# Altium footprint library Inductors THD.PcbLib: 43 footprints (part 3 of 4) (continued)
## IND_TECHPOWER_C20800136 [mm] "3-wire Common Mode Power Inductor" (continued)
  text "10" at 23.19,-4.894 h1
  text "9" at 19.264,-13.426 h1
  text "6" at -16.327,-17.004 h1
  text "5" at -21.247,-9.957 h1
  text "2" at -6.598,22.734 h1
  text "1" at 1.902,23.579 h1
  text "7" at -1.344,-6.369 h1
  text "8" at 1.473,-6.34 h1
  text "11" at 6.149,2.165 h1
  text "12" at 4.574,4.661 h1
  text "3" at -4.858,4.334 h1
  text "4" at -6.245,1.847 h1
Mechanical 8:
  circle w0.1: c0,0 r2
  circle w0.1: c0,0 r10
  circle w0.1: c0,0 r22.5
  circle w0.1: c9.659,2.588 r1
  circle w0.1: c7.66,6.428 r1
  circle w0.1: c0,22.5 r1
  circle w0.1: c-3.907,22.158 r1
  circle w0.1: c-7.071,7.071 r1
  circle w0.1: c-9.397,3.42 r1
  circle w0.1: c-2.588,-9.659 r1
  circle w0.1: c1.736,-9.848 r1
  circle w0.1: c-17.236,-14.463 r1
  circle w0.1: c-19.486,-11.25 r1
  circle w0.1: c19.486,-11.25 r1
  circle w0.1: c21.143,-7.695 r1
  lines w0.1: -19.919,-11.5 -19.486,-11.25 ; -19.736,-10.817 -19.486,-11.25 ; -19.236,-11.683 -19.486,-11.25 ; -19.053,-11 -19.486,-11.25 ; -17.619,-14.784 -17.236,-14.463 ; -17.557,-14.08 -17.236,-14.463 ; -16.915,-14.846 -17.236,-14.463 ; -16.853,-14.141 -17.236,-14.463 ; -9.897,3.42 -9.397,3.42 ; -9.397,2.92 -9.397,3.42 ; -9.397,3.92 -9.397,3.42 ; -8.897,3.42 -9.397,3.42 ; -7.571,7.071 -7.071,7.071 ; -7.071,6.571 -7.071,7.071 ; -7.071,7.571 -7.071,7.071 ; -6.571,7.071 -7.071,7.071 ; -4.399,22.071 -3.907,22.158 ; -3.994,22.651 -3.907,22.158 ; -3.82,21.666 -3.907,22.158 ; -3.415,22.245 -3.907,22.158 ; -3.021,-9.909 -2.588,-9.659 ; -2.838,-9.226 -2.588,-9.659 ; -2.338,-10.092 -2.588,-9.659 ; -2.155,-9.409 -2.588,-9.659 ; -0.5,0 0,0 ; -0.5,22.5 0,22.5 ; 0,-0.5 0,0 ; 0,0.5 0,0 ; 0,22 0,22.5 ; 0,23 0,22.5 ; 0.5,0 0,0 ; 0.5,22.5 0,22.5 ; 1.303,-10.098 1.736,-9.848 ; 1.486,-9.415 1.736,-9.848 ; 1.986,-10.281 1.736,-9.848 ; 2.169,-9.598 1.736,-9.848 ; 7.227,6.678 7.66,6.428 ; 7.41,5.995 7.66,6.428 ; 7.91,6.861 7.66,6.428 ; 8.093,6.178 7.66,6.428 ; 9.226,2.838 9.659,2.588 ; 9.409,2.155 9.659,2.588 ; 9.909,3.021 9.659,2.588 ; 10.092,2.338 9.659,2.588 ; 19.053,-11 19.486,-11.25 ; 19.236,-11.683 19.486,-11.25 ; 19.736,-10.817 19.486,-11.25 ; 19.919,-11.5 19.486,-11.25 ; 20.673,-7.524 21.143,-7.695 ; 20.972,-8.165 21.143,-7.695 ; 21.314,-7.226 21.143,-7.695 ; 21.613,-7.866 21.143,-7.695 ; -19.486,-11.25 0,0 ; -17.236,-14.463 0,0 ; -9.397,3.42 0,0 ; -7.071,7.071 0,0 ; -3.907,22.158 0,0 ; -2.588,-9.659 0,0 ; 0,0 0,22.5 ; 0,0 19.486,-11.25 ; 0,0 21.143,-7.695 ; 0,0 1.736,-9.848 ; 0,0 9.659,2.588 ; 0,0 7.66,6.428
  text "1" at -0.25,22 h1
  text "2" at -4.182,21.602 h1
  text "5" at -18.867,-11.321 h1
  text "6" at -16.631,-14.406 h1
  text "9" at 19.236,-10.682 h1
  text "10" at 20.879,-6.96 h1
  text "3" at -6.98,6.455 h1
  text "4" at -9.064,2.873 h1
  text "7" at -2.121,-9.267 h1
  text "8" at 1.994,-9.295 h1
  text "11" at 9.047,2.942 h1
  text "12" at 6.872,6.589 h1
Mechanical 14:
  circle w0.1: c0,0 r25.25
  circle w0.1: c0,0 r2
  circle w0.5: c-2.288,26.15 r0.2
  circle w0.5: c-21.503,-15.056 r0.2
  circle w0.5: c23.791,-11.094 r0.2
  lines w0.1: -19.523,6.254 ccw(c0,0) -18.14,-9.549 ; -18.975,7.758 cw(c0,0) -18.14,9.549 ; -17.34,-10.935 ccw(c0,0) -16.206,-12.554 ; -17.34,10.935 cw(c0,0) -16.206,12.554 ; -15.178,-13.78 ccw(c0,0) -13.78,-15.178 ; -15.178,13.78 cw(c0,0) -13.78,15.178 ; -12.554,-16.206 ccw(c0,0) -10.935,-17.34 ; -12.554,16.206 cw(c0,0) -10.935,17.34 ; -11.525,3.343 ccw(c0,0) -10.769,-5.294 ; -10.978,4.847 cw(c0,0) -10.769,5.294 ; -9.969,-6.679 ccw(c0,0) -9.686,-7.083 ; -9.969,6.679 cw(c0,0) -9.686,7.083 ; -9.549,-18.14 ccw(c0,0) -7.758,-18.975 ; -9.549,18.14 cw(c0,0) -7.758,18.975 ; -8.658,-8.309 ccw(c0,0) -8.309,-8.658 ; -8.658,8.309 cw(c0,0) -8.309,8.658 ; -7.083,-9.686 ccw(c0,0) -6.679,-9.969 ; -7.083,9.686 cw(c0,0) -6.679,9.969 ; -6.254,-19.523 ccw(c0,0) -4.345,-20.034 ; -6.254,19.523 cw(c0,0) -4.345,20.034 ; -5.294,-10.769 ccw(c0,0) -4.847,-10.978 ; -5.294,10.769 cw(c0,0) -4.847,10.978 ; -3.343,-11.525 ccw(c0,0) -2.867,-11.652 ; -3.343,11.525 cw(c0,0) -2.867,11.652 ; -2.769,-20.312 ccw(c0,0) -0.8,-20.484 ; -2.769,20.312 cw(c0,0) -0.8,20.484 ; -1.291,-11.93 ccw(c0,0) -0.8,-11.973 ; -1.291,11.93 cw(c0,0) -0.8,11.973 ; 0.8,-20.484 ccw(c0,0) 2.769,-20.312 ; 0.8,-11.973 ccw(c0,0) 1.291,-11.93 ; 0.8,11.973 cw(c0,0) 8.658,8.309 ; 0.8,20.484 cw(c0,0) 15.178,13.78 ; 2.867,-11.652 ccw(c0,0) 9.969,-6.679 ; 4.345,-20.034 ccw(c0,0) 17.34,-10.935 ; 9.686,7.083 cw(c0,0) 9.969,6.679 ; 10.769,-5.294 ccw(c0,0) 10.978,-4.847 ; 10.769,5.294 cw(c0,0) 10.978,4.847 ; 11.525,-3.343 ccw(c0,0) 11.652,-2.867 ; 11.525,3.343 cw(c0,0) 11.652,2.867 ; 11.93,-1.291 ccw(c0,0) 11.973,-0.8 ; 11.93,1.291 cw(c0,0) 11.973,0.8 ; 16.206,12.554 cw(c0,0) 17.34,10.935 ; 18.14,-9.549 ccw(c0,0) 18.975,-7.758 ; 18.14,9.549 cw(c0,0) 18.975,7.758 ; 19.523,-6.254 ccw(c0,0) 20.034,-4.345 ; 19.523,6.254 cw(c0,0) 20.034,4.345 ; 20.312,-2.769 ccw(c0,0) 20.484,-0.8 ; 20.312,2.769 cw(c0,0) 20.484,0.8 ; -21.417,6.944 cw(c-21.143,7.695) -20.869,8.447 -9.123,4.172 cw(c-9.397,3.42) -9.671,2.668 -21.417,6.944 ; -19.886,-10.557 ccw(c-19.486,-11.25) -19.086,-11.943 -8.26,-5.693 ccw(c-8.66,-5) -9.06,-4.307 -19.886,-10.557 ; -19.886,10.557 cw(c-19.486,11.25) -19.086,11.943 -8.26,5.693 cw(c-8.66,5) -9.06,4.307 -19.886,10.557 ; -17.75,-13.85 ccw(c-17.236,-14.463) -16.722,-15.076 -7.146,-7.041 ccw(c-7.66,-6.428) -8.175,-5.815 -17.75,-13.85 ; -17.75,13.85 cw(c-17.236,14.463) -16.722,15.076 -7.146,7.041 cw(c-7.66,6.428) -8.175,5.815 -17.75,13.85 ; -15.076,-16.722 ccw(c-14.463,-17.236) -13.85,-17.75 -5.815,-8.175 ccw(c-6.428,-7.66) -7.041,-7.146 -15.076,-16.722 ; -15.076,16.722 cw(c-14.463,17.236) -13.85,17.75 -5.815,8.175 cw(c-6.428,7.66) -7.041,7.146 -15.076,16.722 ; -11.943,-19.086 ccw(c-11.25,-19.486) -10.557,-19.886 -4.307,-9.06 ccw(c-5,-8.66) -5.693,-8.26 -11.943,-19.086 ; -11.943,19.086 cw(c-11.25,19.486) -10.557,19.886 -4.307,9.06 cw(c-5,8.66) -5.693,8.26 -11.943,19.086 ; -8.447,-20.869 ccw(c-7.695,-21.143) -6.944,-21.417 -2.668,-9.671 ccw(c-3.42,-9.397) -4.172,-9.123 -8.447,-20.869 ; -8.447,20.869 cw(c-7.695,21.143) -6.944,21.417 -2.668,9.671 cw(c-3.42,9.397) -4.172,9.123 -8.447,20.869 ; -4.695,-22.019 ccw(c-3.907,-22.158) -3.119,-22.297 -0.949,-9.987 ccw(c-1.736,-9.848) -2.524,-9.709 -4.695,-22.019 ; -4.695,22.019 cw(c-3.907,22.158) -3.119,22.297 -0.949,9.987 cw(c-1.736,9.848) -2.524,9.709 -4.695,22.019 ; -0.8,-22.5 ccw(c0,-22.5) 0.8,-22.5 0.8,-10 ccw(c0,-10) -0.8,-10 -0.8,-22.5 ; -0.8,10 ccw(c0,10) 0.8,10 0.8,22.5 ccw(c0,22.5) -0.8,22.5 -0.8,10 ; 0.949,-9.987 cw(c1.736,-9.848) 2.524,-9.709 4.695,-22.019 cw(c3.907,-22.158) 3.119,-22.297 0.949,-9.987 ; 7.146,7.041 ccw(c7.66,6.428) 8.175,5.815 17.75,13.85 ccw(c17.236,14.463) 16.722,15.076 7.146,7.041 ; 8.26,-5.693 cw(c8.66,-5) 9.06,-4.307 19.886,-10.557 cw(c19.486,-11.25) 19.086,-11.943 8.26,-5.693 ; 8.26,5.693 ccw(c8.66,5) 9.06,4.307 19.886,10.557 ccw(c19.486,11.25) 19.086,11.943 8.26,5.693 ; 9.123,-4.172 cw(c9.397,-3.42) 9.671,-2.668 21.417,-6.944 cw(c21.143,-7.695) 20.869,-8.447 9.123,-4.172 ; 9.123,4.172 ccw(c9.397,3.42) 9.671,2.668 21.417,6.944 ccw(c21.143,7.695) 20.869,8.447 9.123,4.172 ; 9.709,-2.524 cw(c9.848,-1.736) 9.987,-0.949 22.297,-3.119 cw(c22.158,-3.907) 22.019,-4.695 9.709,-2.524 ; 9.709,2.524 ccw(c9.848,1.736) 9.987,0.949 22.297,3.119 ccw(c22.158,3.907) 22.019,4.695 9.709,2.524 ; 10,-0.8 cw(c10,0) 10,0.8 22.5,0.8 cw(c22.5,0) 22.5,-0.8 10,-0.8
  text "10" at 23.19,-4.894 h1
  text "9" at 19.264,-13.426 h1
  text "6" at -16.327,-17.004 h1
  text "5" at -21.247,-9.957 h1
  text "2" at -6.598,22.734 h1
  text "1" at 1.902,23.579 h1
  text "7" at -1.344,-6.369 h1
  text "8" at 1.473,-6.34 h1
  text "11" at 6.149,2.165 h1
  text "12" at 4.574,4.661 h1
  text "3" at -4.858,4.334 h1
  text "4" at -6.245,1.847 h1
3D body "IND_TECHPOWER_C20800136.stp": height 40.3, standoff -4, extent -25.25,-25.224 25.25,25.225

## IND_TRACO_TCK-048 [mm] "Common Mode Choke TCK-048"
height 9.8
pads (4):
  round 1.7 hole 1: 1(-3.8,-3.75) 2(3.8,-3.75) 3(3.8,3.75) 4(-3.8,3.75)
Top Overlay:
  circle w0.5: c-6.5,-4.3 r0.25
  lines w0.1: -2.762,-2.904 -2.039,-2.042 cw(c-1.848,-2.202) -1.657,-2.363 -2.621,-3.512 ; -2.762,2.904 -2.039,2.042 ccw(c-1.848,2.202) -1.657,2.363 -2.621,3.512 ; -2.587,-4.279 ccw(c0,0) -1.943,-4.607 ; -2.513,4.323 cw(c0,0) -1.943,4.607 ; -2.48,-3.795 -1.654,-2.365 cw(c-1.438,-2.489) -1.221,-2.614 -2.347,-4.563 ; -2.48,3.795 -1.654,2.365 ccw(c-1.438,2.489) -1.221,2.614 -2.347,4.563 ; -1.473,-4.778 ccw(c0,0) -1.113,-4.874 ; -1.473,4.778 cw(c0,0) -1.113,4.874 ; -0.621,-4.961 ccw(c0,0) -0.25,-4.994 ; -0.621,4.961 cw(c0,0) -0.25,4.994 ; 0.25,-4.994 ccw(c0,0) 0.621,-4.961 ; 0.25,4.994 cw(c0,0) 0.621,4.961 ; 1.113,-4.875 ccw(c0,0) 1.473,-4.778 ; 1.113,4.875 cw(c0,0) 1.473,4.778 ; 1.942,-4.607 ccw(c0,0) 2.587,-4.279 ; 1.942,4.607 cw(c0,0) 2.513,4.323 ; 2.347,-4.563 1.221,-2.614 cw(c1.438,-2.489) 1.654,-2.365 2.48,-3.795 ; 2.347,4.563 1.221,2.614 ccw(c1.438,2.489) 1.654,2.365 2.48,3.795 ; 2.621,-3.512 1.657,-2.363 cw(c1.848,-2.202) 2.039,-2.042 2.762,-2.904 ; 2.621,3.512 1.657,2.363 ccw(c1.848,2.202) 2.039,2.042 2.762,2.904 ; -1.988,4.732 cw(c-1.751,4.809) -1.518,4.901 -0.749,2.787 cw(c-0.983,2.701) -1.218,2.616 -1.988,4.732 ; -1.987,-4.731 ccw(c-1.75,-4.809) -1.519,-4.903 -0.748,-2.787 ccw(c-0.983,-2.701) -1.218,-2.616 -1.987,-4.731 ; -1.136,5.005 cw(c-0.889,5.04) -0.644,5.091 -0.253,2.875 cw(c-0.499,2.831) -0.745,2.788 -1.136,5.005 ; -1.136,-5.004 ccw(c-0.888,-5.04) -0.644,-5.092 -0.253,-2.875 ccw(c-0.499,-2.831) -0.745,-2.788 -1.136,-5.004 ; -0.25,2.875 ccw(c0,2.875) 0.25,2.875 0.25,5.125 ccw(c0,5.117) -0.25,5.127 -0.25,2.875 ; -0.25,-5.125 ccw(c0,-5.117) 0.25,-5.127 0.25,-2.875 ccw(c0,-2.875) -0.25,-2.875 -0.25,-5.125 ; 0.253,2.875 ccw(c0.499,2.831) 0.745,2.788 1.136,5.004 ccw(c0.888,5.04) 0.644,5.092 0.253,2.875 ; 0.253,-2.875 cw(c0.499,-2.831) 0.745,-2.788 1.136,-5.005 cw(c0.889,-5.04) 0.644,-5.091 0.253,-2.875 ; 0.748,2.787 ccw(c0.983,2.701) 1.218,2.616 1.987,4.731 ccw(c1.75,4.809) 1.519,4.903 0.748,2.787 ; 0.749,-2.787 cw(c0.983,-2.701) 1.218,-2.616 1.988,-4.732 cw(c1.751,-4.809) 1.518,-4.901 0.749,-2.787
  lines w0.2: -4.465,-2.25 cw(c0,0) -4.465,2.25 ; -2.164,2.078 ccw(c0,0) -2.121,-2.121 ; 2.114,-2.129 ccw(c0,0) 2.12,2.123 ; 4.465,-2.25 ccw(c0,0) 4.465,2.25 ; -5.5,-5.5 -5.5,5.5 5.5,5.5 5.5,-5.5 -5.5,-5.5
  text "4" at -7.1,5.5 h1.5
  text "2" at 6.2,-7.2 h1.5
  text "3" at 6.2,5.6 h1.5
  text "1" at -6.8,-7.2 h1.5
Mechanical 8:
  circle w0.05: c-3.81,-3.75 r0.85
  circle w0.05: c3.81,-3.75 r0.85
  circle w0.05: c3.81,3.75 r0.85
  circle w0.05: c-3.81,3.75 r0.85
  lines w0.05: -4.31,-3.75 -3.81,-3.75 ; -4.31,3.75 -3.81,3.75 ; -3.81,-4.25 -3.81,-3.75 ; -3.81,-3.25 -3.81,-3.75 ; -3.81,3.25 -3.81,3.75 ; -3.81,4.25 -3.81,3.75 ; -3.31,-3.75 -3.81,-3.75 ; -3.31,3.75 -3.81,3.75 ; 3.31,-3.75 3.81,-3.75 ; 3.31,3.75 3.81,3.75 ; 3.81,-4.25 3.81,-3.75 ; 3.81,-3.25 3.81,-3.75 ; 3.81,3.25 3.81,3.75 ; 3.81,4.25 3.81,3.75 ; 4.31,-3.75 3.81,-3.75 ; 4.31,3.75 3.81,3.75
  lines w0.1: -0.5,0 0,0 ; 0,-0.5 0,0 ; 0,0.5 0,0 ; 0.5,0 0,0
Mechanical 14:
  circle w0.1: c0,0 r5
  circle w0.1: c0,0 r3
  lines w0.1: -5.5,-4.5 ccw(c-4.5,-4.5) -4.5,-5.5 -3.4,-5.5 -3.4,-4.5 -2.5,-4.5 -2.5,-5.5 -0.45,-5.5 -0.45,-4.5 0.45,-4.5 0.45,-5.5 4.5,-5.5 ccw(c4.5,-4.5) 5.5,-4.5 5.5,-3.4 4.5,-3.4 4.5,-2.5 5.5,-2.5 5.5,-0.45 4.5,-0.45 4.5,0.45 5.5,0.45 5.5,2.5 4.5,2.5 4.5,3.4 5.5,3.4 5.5,4.5 ccw(c4.5,4.5) 4.5,5.5 0.45,5.5 0.45,4.5 -0.45,4.5 -0.45,5.5 -2.5,5.5 -2.5,4.5 -3.4,4.5 -3.4,5.5 -4.5,5.5 ccw(c-4.5,4.5) -5.5,4.5 -5.5,3.4 -4.5,3.4 -4.5,2.5 -5.5,2.5 -5.5,0.45 -4.5,0.45 -4.5,-0.45 -5.5,-0.45 -5.5,-2.5 -4.5,-2.5 -4.5,-3.4 -5.5,-3.4 -5.5,-4.5
3D body "IND_TRACO_TCK-048.stp": height 9.86, standoff -3.6, extent -5.5,-5.5 5.5,5.5

## IND_WURTH_WE-CMB-XL [mm] "WURTH Common Mode Choke WE-CMB XL Series"
height 35
pads (4):
  round 2 hole 1.3: 1(-12.5,7.5) 6(12.5,7.5) 7(12.5,-7.5) 12(-12.5,-7.5)
Top Overlay:
  lines w0.2: -15.2,-2.8 -14.75,-2.8 ; -15.2,2.8 -14.75,2.8 ; -15,-2.8 -15,2.8 ; -14.9,-2.8 -14.9,2.8 ; -14.25,-7.5 -13.8,-7.5 ; -14.25,7.5 -13.8,7.5 ; -12.75,-6.224 -12.75,6.224 ; -12.6,-8.796 -12.6,-11 -15.2,-11 -15.2,11 -12.6,11 -12.6,8.796 ; -11.75,-6.438 -11.75,6.438 ; -11.562,-8.4 -10.2,-8.4 -10.2,-11 -6.9,-11 -6.9,-8.4 -4.5,-8.4 -4.5,-11 -1.2,-11 -1.2,-8.4 1.2,-8.4 1.2,-11 4.5,-11 4.5,-8.4 6.9,-8.4 6.9,-11 10.2,-11 10.2,-8.4 11.562,-8.4 ; -11.562,8.4 -10.2,8.4 -10.2,11 -6.9,11 -6.9,8.4 -4.5,8.4 -4.5,11 -1.2,11 -1.2,8.4 1.2,8.4 1.2,11 4.5,11 4.5,8.4 6.9,8.4 6.9,11 10.2,11 10.2,8.4 11.562,8.4 ; -11.2,-7.5 -3.442,-7.5 ; -11.2,7.5 -3.442,7.5 ; 3.442,-7.5 11.2,-7.5 ; 3.442,7.5 11.2,7.5 ; 11.75,-6.438 11.75,6.438 ; 12.6,-8.796 12.6,-11 15.2,-11 15.2,11 12.6,11 12.6,8.796 ; 12.75,-6.224 12.75,6.224 ; 13.8,-7.5 14.25,-7.5 ; 13.8,7.5 14.25,7.5 ; -9.75,-7 ccw(c-9.25,-7) -8.75,-7 ; -9.75,-7 cw(c-10.25,-7) -10.75,-7 -10.75,7 cw(c-10.25,7) -9.75,7 ; -9.75,-7 -9.75,7 ; -9.75,7 cw(c-9.25,7) -8.75,7 ; -8.75,-7 ccw(c-8.25,-7) -7.75,-7 ; -8.75,-7 -8.75,7 ; -8.75,7 cw(c-8.25,7) -7.75,7 ; -7.75,-7 ccw(c-7.25,-7) -6.75,-7 -6.75,7 ccw(c-7.25,7) -7.75,7 ; -7.75,-7 -7.75,7 ; -4.942,-7 ccw(c-4.442,-7) -3.942,-7 ; -4.942,-7 cw(c-5.442,-7) -5.942,-7 -5.942,7 cw(c-5.442,7) -4.942,7 ; -4.942,-7 -4.942,7 ; -4.942,7 cw(c-4.442,7) -3.942,7 ; -3.942,-7 ccw(c-3.442,-7) -2.942,-7 ; -3.942,-7 -3.942,7 ; -3.942,7 cw(c-3.442,7) -2.942,7 ; -2.942,-7 -2.942,7 ; -2.942,-7 2.942,-7 ; -2.942,7 2.942,7 ; 2.942,-7 ccw(c3.442,-7) 3.942,-7 ; 2.942,-7 2.942,7 ; 2.942,7 cw(c3.442,7) 3.942,7 ; 3.942,-7 ccw(c4.442,-7) 4.942,-7 ; 3.942,-7 3.942,7 ; 3.942,7 cw(c4.442,7) 4.942,7 ; 4.942,-7 ccw(c5.442,-7) 5.942,-7 5.942,7 ccw(c5.442,7) 4.942,7 ; 4.942,-7 4.942,7 ; 7.75,-7 ccw(c8.25,-7) 8.75,-7 ; 7.75,-7 cw(c7.25,-7) 6.75,-7 6.75,7 cw(c7.25,7) 7.75,7 ; 7.75,-7 7.75,7 ; 7.75,7 cw(c8.25,7) 8.75,7 ; 8.75,-7 ccw(c9.25,-7) 9.75,-7 ; 8.75,-7 8.75,7 ; 8.75,7 cw(c9.25,7) 9.75,7 ; 9.75,-7 ccw(c10.25,-7) 10.75,-7 10.75,7 ccw(c10.25,7) 9.75,7 ; 9.75,-7 9.75,7 ; -14.75,-7 ccw(c-14.25,-7) -13.75,-7 -13.75,7 ccw(c-14.25,7) -14.75,7 -14.75,-7 ; 13.75,-7 ccw(c14.25,-7) 14.75,-7 14.75,7 ccw(c14.25,7) 13.75,7 13.75,-7
  text "6" at 14.8,9.1 h1.5
  text "7" at 14.8,-10.1 h1.5
  text "1" at -13.3,9.2 h1.5
  text "12" at -13.3,-10.7 h1.5
Mechanical 8:
  lines w0.1: -13,-7.5 -12.5,-7.5 ; -13,7.5 -12.5,7.5 ; -12.5,-8 -12.5,-7.5 ; -12.5,-7 -12.5,-7.5 ; -12.5,7 -12.5,7.5 ; -12.5,8 -12.5,7.5 ; -12,-7.5 -12.5,-7.5 ; -12,7.5 -12.5,7.5 ; -0.5,0 0,0 ; 0,-0.5 0,0 ; 0,0.5 0,0 ; 0.5,0 0,0 ; 12,-7.5 12.5,-7.5 ; 12,7.5 12.5,7.5 ; 12.5,-8 12.5,-7.5 ; 12.5,-7 12.5,-7.5 ; 12.5,7 12.5,7.5 ; 12.5,8 12.5,7.5 ; 13,-7.5 12.5,-7.5 ; 12.5,7.5 13,7.5 12.5,7.5
Mechanical 14:
  lines w0.1: -15.2,-2.8 -12.6,-2.8 -12.6,2.8 -15.2,2.8 ; -14.25,-7.5 -3.442,-7.5 ; -14.25,7.5 -3.442,7.5 ; 3.442,-7.5 14.25,-7.5 ; 3.442,7.5 14.25,7.5 ; -13.75,-7 ccw(c-13.25,-7) -12.75,-7 ; -13.75,-7 cw(c-14.25,-7) -14.75,-7 -14.75,7 cw(c-14.25,7) -13.75,7 ; -13.75,-7 -13.75,7 ; -13.75,7 cw(c-13.25,7) -12.75,7 ; -12.75,-7 ccw(c-12.25,-7) -11.75,-7 ; -12.75,-7 -12.75,7 ; -12.75,-7 -12.75,7 ; -12.75,7 cw(c-12.25,7) -11.75,7 ; -11.75,-7 -11.75,7 ; -11.75,-7 -11.75,7 ; -10.75,-7 ccw(c-10.25,-7) -9.75,-7 ; -10.75,-7 -10.75,7 ; -10.75,-7 -10.75,7 ; -10.75,7 cw(c-10.25,7) -9.75,7 ; -9.75,-7 ccw(c-9.25,-7) -8.75,-7 ; -9.75,-7 -9.75,7 ; -9.75,-7 -9.75,7 ; -9.75,7 cw(c-9.25,7) -8.75,7 ; -8.75,-7 ccw(c-8.25,-7) -7.75,-7 ; -8.75,-7 -8.75,7 ; -8.75,-7 -8.75,7 ; -8.75,7 cw(c-8.25,7) -7.75,7 ; -7.75,-7 ccw(c-7.25,-7) -6.75,-7 -6.75,7 ccw(c-7.25,7) -7.75,7 ; -7.75,-7 -7.75,7 ; -7.75,-7 -7.75,7 ; -4.942,-7 ccw(c-4.442,-7) -3.942,-7 ; -4.942,-7 cw(c-5.442,-7) -5.942,-7 -5.942,7 cw(c-5.442,7) -4.942,7 ; -4.942,-7 -4.942,7 ; -4.942,7 cw(c-4.442,7) -3.942,7 ; -3.942,-7 ccw(c-3.442,-7) -2.942,-7 ; -3.942,-7 -3.942,7 ; -3.942,7 cw(c-3.442,7) -2.942,7 ; -2.942,-7 -2.942,7 ; -2.942,-7 2.942,-7 ; -2.942,7 2.942,7 ; 2.942,-7 ccw(c3.442,-7) 3.942,-7 ; 2.942,-7 2.942,7 ; 2.942,7 cw(c3.442,7) 3.942,7 ; 3.942,-7 ccw(c4.442,-7) 4.942,-7 ; 3.942,-7 3.942,7 ; 3.942,7 cw(c4.442,7) 4.942,7 ; 4.942,-7 ccw(c5.442,-7) 5.942,-7 5.942,7 ccw(c5.442,7) 4.942,7 ; 4.942,-7 4.942,7 ; 7.75,-7 ccw(c8.25,-7) 8.75,-7 ; 7.75,-7 cw(c7.25,-7) 6.75,-7 6.75,7 cw(c7.25,7) 7.75,7 ; 7.75,-7 7.75,7 ; 7.75,-7 7.75,7 ; 7.75,7 cw(c8.25,7) 8.75,7 ; 8.75,-7 ccw(c9.25,-7) 9.75,-7 ; 8.75,-7 8.75,7 ; 8.75,-7 8.75,7 ; 8.75,7 cw(c9.25,7) 9.75,7 ; 9.75,-7 ccw(c10.25,-7) 10.75,-7 ; 9.75,-7 9.75,7 ; 9.75,-7 9.75,7 ; 9.75,7 cw(c10.25,7) 10.75,7 ; 10.75,-7 10.75,7 ; 10.75,-7 10.75,7 ; 11.75,-7 ccw(c12.25,-7) 12.75,-7 ; 11.75,-7 11.75,7 ; 11.75,-7 11.75,7 ; 11.75,7 cw(c12.25,7) 12.75,7 ; 12.75,-7 ccw(c13.25,-7) 13.75,-7 ; 12.75,-7 12.75,7 ; 12.75,-7 12.75,7 ; 12.75,7 cw(c13.25,7) 13.75,7 ; 13.75,-7 ccw(c14.25,-7) 14.75,-7 14.75,7 ccw(c14.25,7) 13.75,7 ; 13.75,-7 13.75,7 ; -15.2,-11 -15.2,11 -12.6,11 -12.6,8.4 -10.2,8.4 -10.2,11 -6.9,11 -6.9,8.4 -4.5,8.4 -4.5,11 -1.2,11 -1.2,8.4 1.2,8.4 1.2,11 4.5,11 4.5,8.4 6.9,8.4 6.9,11 10.2,11 10.2,8.4 12.6,8.4 12.6,11 15.2,11 15.2,-11 12.6,-11 12.6,-8.4 10.2,-8.4 10.2,-11 6.9,-11 6.9,-8.4 4.5,-8.4 4.5,-11 1.2,-11 1.2,-8.4 -1.2,-8.4 -1.2,-11 -4.5,-11 -4.5,-8.4 -6.9,-8.4 -6.9,-11 -10.2,-11 -10.2,-8.4 -12.6,-8.4 -12.6,-11 -15.2,-11
  text "12" at -13.3,-10.7 h1.5
  text "1" at -13.3,9.2 h1.5
  text "7" at 14.8,-10.1 h1.5
  text "6" at 14.8,9.1 h1.5
3D body "IND_WURTH_WE-CMB-XL.stp": height 35, standoff -3.8, extent -15.2,-11 15.2,11

## IND_WURTH_WE-CMB-XS [mm] "WURTH Common Mode Choke WE-CMB XS Series"
height 18
pads (4):
  round 1.7 hole 1: 1(-5,2.25) 2(-5,-2.25) 3(5,-2.25) 4(5,2.25)
Top Overlay:
  lines w0.2: -6.487,-2.75 -6.244,-2.75 ; -6.487,2.75 -6.244,2.75 ; -6.26,-3.25 cw(c-6.26,-2.5) -7.01,-2.5 -7.01,2.5 cw(c-6.26,2.5) -6.26,3.25 ; -5.854,-1.338 -5.854,1.338 ; -5.817,-3.196 cw(c-5.537,-2.5) -6.287,-2.5 -6.287,2.5 cw(c-5.537,2.5) -5.817,3.196 ; -5.78,-3.25 cw(c-5.78,-2.5) -6.53,-2.5 -6.53,2.5 cw(c-5.78,2.5) -5.78,3.25 ; -5.75,-3.25 -6.51,-3.25 ; -5.75,3.25 -6.51,3.25 ; -5.134,-1.007 -5.134,1.007 ; -4.78,-1.02 -4.78,1.02 ; -4.25,-3.25 -2.113,-3.25 ccw(c-2.113,-2.5) -1.406,-2.75 ; -4.25,3.25 -2.109,3.25 cw(c-2.109,2.5) -1.402,2.75 ; -3.95,3.25 -3.95,3.525 ccw(c-4.175,3.525) -4.175,3.75 -5.1,3.75 ccw(c-5.1,2.75) -5.966,3.25 -6.51,3.25 ; -3.854,-2.75 -3.679,-2.75 ; -3.854,2.75 -3.679,2.75 ; -3.212,-2.75 3.217,-2.75 ; -3.212,2.75 3.217,2.75 ; -2.972,-3.25 cw(c-2.972,-2.5) -3.722,-2.5 -3.722,2.5 cw(c-2.972,2.5) -2.972,3.25 ; -2.505,-3.25 cw(c-2.505,-2.5) -3.255,-2.5 -3.255,2.5 cw(c-2.505,2.5) -2.505,3.25 ; -2.5,3.25 -2.5,3.525 cw(c-2.275,3.525) -2.275,3.75 2.275,3.75 cw(c2.275,3.525) 2.5,3.525 2.5,3.25 3.95,3.25 3.95,3.525 cw(c4.175,3.525) 4.175,3.75 5.1,3.75 cw(c5.1,2.75) 5.966,3.25 6.51,3.25 ; 1.406,-2.75 ccw(c2.113,-2.5) 2.113,-3.25 4.25,-3.25 ; 1.406,2.75 cw(c2.113,2.5) 2.113,3.25 4.25,3.25 ; 2.505,-3.25 ccw(c2.505,-2.5) 3.255,-2.5 3.255,2.5 ; 2.509,3.25 cw(c2.509,2.5) 3.259,2.499 ; 2.972,-3.25 ccw(c2.972,-2.5) 3.722,-2.5 3.722,2.5 ; 2.976,3.25 cw(c2.976,2.5) 3.726,2.499 ; 3.683,-2.75 3.854,-2.75 ; 3.683,2.75 3.854,2.75 ; 4.75,-1.025 4.75,1.025 ; 5.103,-1.004 5.103,1.004 ; 5.749,-3.25 ccw(c5.749,-2.5) 6.499,-2.5 6.499,2.5 ; 5.75,-3.25 6.51,-3.25 ; 5.75,3.25 6.51,3.25 ; 5.754,3.25 cw(c5.754,2.5) 6.504,2.499 ; 5.824,-1.31 5.824,1.31 ; 5.843,3.173 cw(c5.512,2.5) 6.262,2.499 ; 5.849,-3.168 ccw(c5.507,-2.5) 6.257,-2.5 6.257,2.5 ; 6.219,-2.75 6.461,-2.75 ; 6.219,2.75 6.461,2.75 ; 6.23,-3.25 ccw(c6.23,-2.5) 6.98,-2.5 6.98,2.5 ; 6.234,3.25 cw(c6.234,2.5) 6.984,2.499 ; -6.51,-3.25 cw(c-6.51,-2.5) -7.26,-2.5 -7.26,2.5 cw(c-6.51,2.5) -6.51,3.25 ; -6.51,-3.25 -5.966,-3.25 ccw(c-5.1,-2.75) -5.1,-3.75 -4.175,-3.75 ccw(c-4.175,-3.525) -3.95,-3.525 -3.95,-3.25 -2.5,-3.25 -2.5,-3.525 ccw(c-2.275,-3.525) -2.305,-3.748 2.275,-3.75 ccw(c2.275,-3.525) 2.5,-3.525 2.5,-3.25 3.95,-3.25 3.95,-3.525 ccw(c4.175,-3.525) 4.175,-3.75 5.1,-3.75 ccw(c5.1,-2.75) 5.966,-3.25 6.51,-3.25 ; 6.51,-3.25 ccw(c6.51,-2.5) 7.26,-2.5 7.26,2.5 ccw(c6.51,2.5) 6.51,3.25
  text "1" at -4.1,4.3 h1.5
Mechanical 8:
  lines w0.1: -5.5,-2.25 -5,-2.25 ; -5.5,2.25 -5,2.25 ; -5,-2.75 -5,-2.25 ; -5,-1.75 -5,-2.25 ; -5,1.75 -5,2.25 ; -5,2.75 -5,2.25 ; -4.5,-2.25 -5,-2.25 ; -4.5,2.25 -5,2.25 ; -0.5,0 0,0 ; 0,-0.5 0,0 ; 0,0.5 0,0 ; 0.5,0 0,0 ; 4.5,-2.25 5,-2.25 ; 4.5,2.25 5,2.25 ; 5,-2.75 5,-2.25 ; 5,-1.75 5,-2.25 ; 5,1.75 5,2.25 ; 5,2.75 5,2.25 ; 5.5,-2.25 5,-2.25 ; 5.5,2.25 5,2.25
Mechanical 14:
  lines w0.1: -6.487,-2.75 -6.244,-2.75 ; -6.487,2.75 -6.244,2.75 ; -6.26,-3.25 cw(c-6.26,-2.5) -7.01,-2.5 -7.01,2.5 cw(c-6.26,2.5) -6.26,3.25 ; -5.811,-2.75 -5.091,-2.75 ; -5.811,2.75 -5.091,2.75 ; -5.78,-3.25 cw(c-5.78,-2.5) -6.53,-2.5 -6.53,2.5 cw(c-5.78,2.5) -5.78,3.25 ; -5.537,-3.25 cw(c-5.537,-2.5) -6.287,-2.5 -6.287,2.5 cw(c-5.537,2.5) -5.537,3.25 ; -5.104,-3.25 cw(c-5.104,-2.5) -5.854,-2.5 -5.854,2.5 cw(c-5.104,2.5) -5.104,3.25 ; -4.737,-2.75 -3.679,-2.75 ; -4.737,2.75 -3.679,2.75 ; -4.384,-3.25 cw(c-4.384,-2.5) -5.134,-2.5 -5.134,2.5 cw(c-4.384,2.5) -4.384,3.25 ; -4.03,-3.25 cw(c-4.03,-2.5) -4.78,-2.5 -4.78,2.5 cw(c-4.03,2.5) -4.03,3.25 ; -3.95,3.25 -3.95,3.525 ccw(c-4.175,3.525) -4.175,3.75 -5.1,3.75 ccw(c-5.1,2.75) -5.966,3.25 -6.51,3.25 ; -3.212,-2.75 3.217,-2.75 ; -3.212,2.75 3.217,2.75 ; -2.972,-3.25 cw(c-2.972,-2.5) -3.722,-2.5 -3.722,2.5 cw(c-2.972,2.5) -2.972,3.25 ; -2.505,-3.25 cw(c-2.505,-2.5) -3.255,-2.5 -3.255,2.5 cw(c-2.505,2.5) -2.505,3.25 ; -2.5,3.25 -2.5,3.525 cw(c-2.275,3.525) -2.275,3.75 2.275,3.75 cw(c2.275,3.525) 2.5,3.525 2.5,3.25 3.95,3.25 3.95,3.525 cw(c4.175,3.525) 4.175,3.75 5.1,3.75 cw(c5.1,2.75) 5.966,3.25 6.51,3.25 ; -1.406,-2.75 cw(c-2.113,-2.5) -2.113,-3.25 -6.51,-3.25 ; -1.402,2.75 ccw(c-2.109,2.5) -2.109,3.25 -6.51,3.25 ; 1.406,-2.75 ccw(c2.113,-2.5) 2.113,-3.25 6.51,-3.25 ; 1.406,2.75 cw(c2.113,2.5) 2.113,3.25 6.51,3.25 ; 2.505,-3.25 ccw(c2.505,-2.5) 3.255,-2.5 3.255,2.5 ; 2.509,3.25 cw(c2.509,2.5) 3.259,2.499 ; 2.972,-3.25 ccw(c2.972,-2.5) 3.722,-2.5 3.722,2.5 ; 2.976,3.25 cw(c2.976,2.5) 3.726,2.499 ; 3.683,-2.75 4.711,-2.75 ; 3.683,2.75 4.711,2.75 ; 4,-3.25 ccw(c4,-2.5) 4.75,-2.5 4.75,2.5 ; 4.004,3.25 cw(c4.004,2.5) 4.754,2.499 ; 4.353,-3.25 ccw(c4.353,-2.5) 5.103,-2.5 5.103,2.5 ; 4.358,3.25 cw(c4.358,2.5) 5.108,2.499 ; 5.065,-2.75 5.786,-2.75 ; 5.065,2.75 5.786,2.75 ; 5.074,-3.25 ccw(c5.074,-2.5) 5.824,-2.5 5.824,2.5 ; 5.079,3.25 cw(c5.079,2.5) 5.829,2.499 ; 5.507,-3.25 ccw(c5.507,-2.5) 6.257,-2.5 6.257,2.5 ; 5.512,3.25 cw(c5.512,2.5) 6.262,2.499 ; 5.749,-3.25 ccw(c5.749,-2.5) 6.499,-2.5 6.499,2.5 ; 5.754,3.25 cw(c5.754,2.5) 6.504,2.499 ; 6.219,-2.75 6.461,-2.75 ; 6.219,2.75 6.461,2.75 ; 6.23,-3.25 ccw(c6.23,-2.5) 6.98,-2.5 6.98,2.5 ; 6.234,3.25 cw(c6.234,2.5) 6.984,2.499 ; -6.51,-3.25 cw(c-6.51,-2.5) -7.26,-2.5 -7.26,2.5 cw(c-6.51,2.5) -6.51,3.25 ; -6.51,-3.25 -5.966,-3.25 ccw(c-5.1,-2.75) -5.1,-3.75 -4.175,-3.75 ccw(c-4.175,-3.525) -3.95,-3.525 -3.95,-3.25 -2.5,-3.25 -2.5,-3.525 ccw(c-2.275,-3.525) -2.305,-3.748 2.275,-3.75 ccw(c2.275,-3.525) 2.5,-3.525 2.5,-3.25 3.95,-3.25 3.95,-3.525 ccw(c4.175,-3.525) 4.175,-3.75 5.1,-3.75 ccw(c5.1,-2.75) 5.966,-3.25 6.51,-3.25 ; 6.51,-3.25 ccw(c6.51,-2.5) 7.26,-2.5 7.26,2.5 ccw(c6.51,2.5) 6.51,3.25
  text "1" at -4.1,4.3 h1.5
3D body "IND_WURTH_WE-CMB-XS.stp": height 17.5, standoff -2.15, extent -7.26,-3.75 7.26,3.75